# Altium footprint library Integrados.PcbLib: 96 footprints (part 4 of 6)
Each footprint in its own frame and in the unit in brackets; x right, y up, seen from the top. Pads: shape width x height; smd on the part's side, far side on the other; paste and mask are expansions set on the pad; w line width, h text height; cw(c..) or ccw(c..) is an arc to the next point about the centre after c.
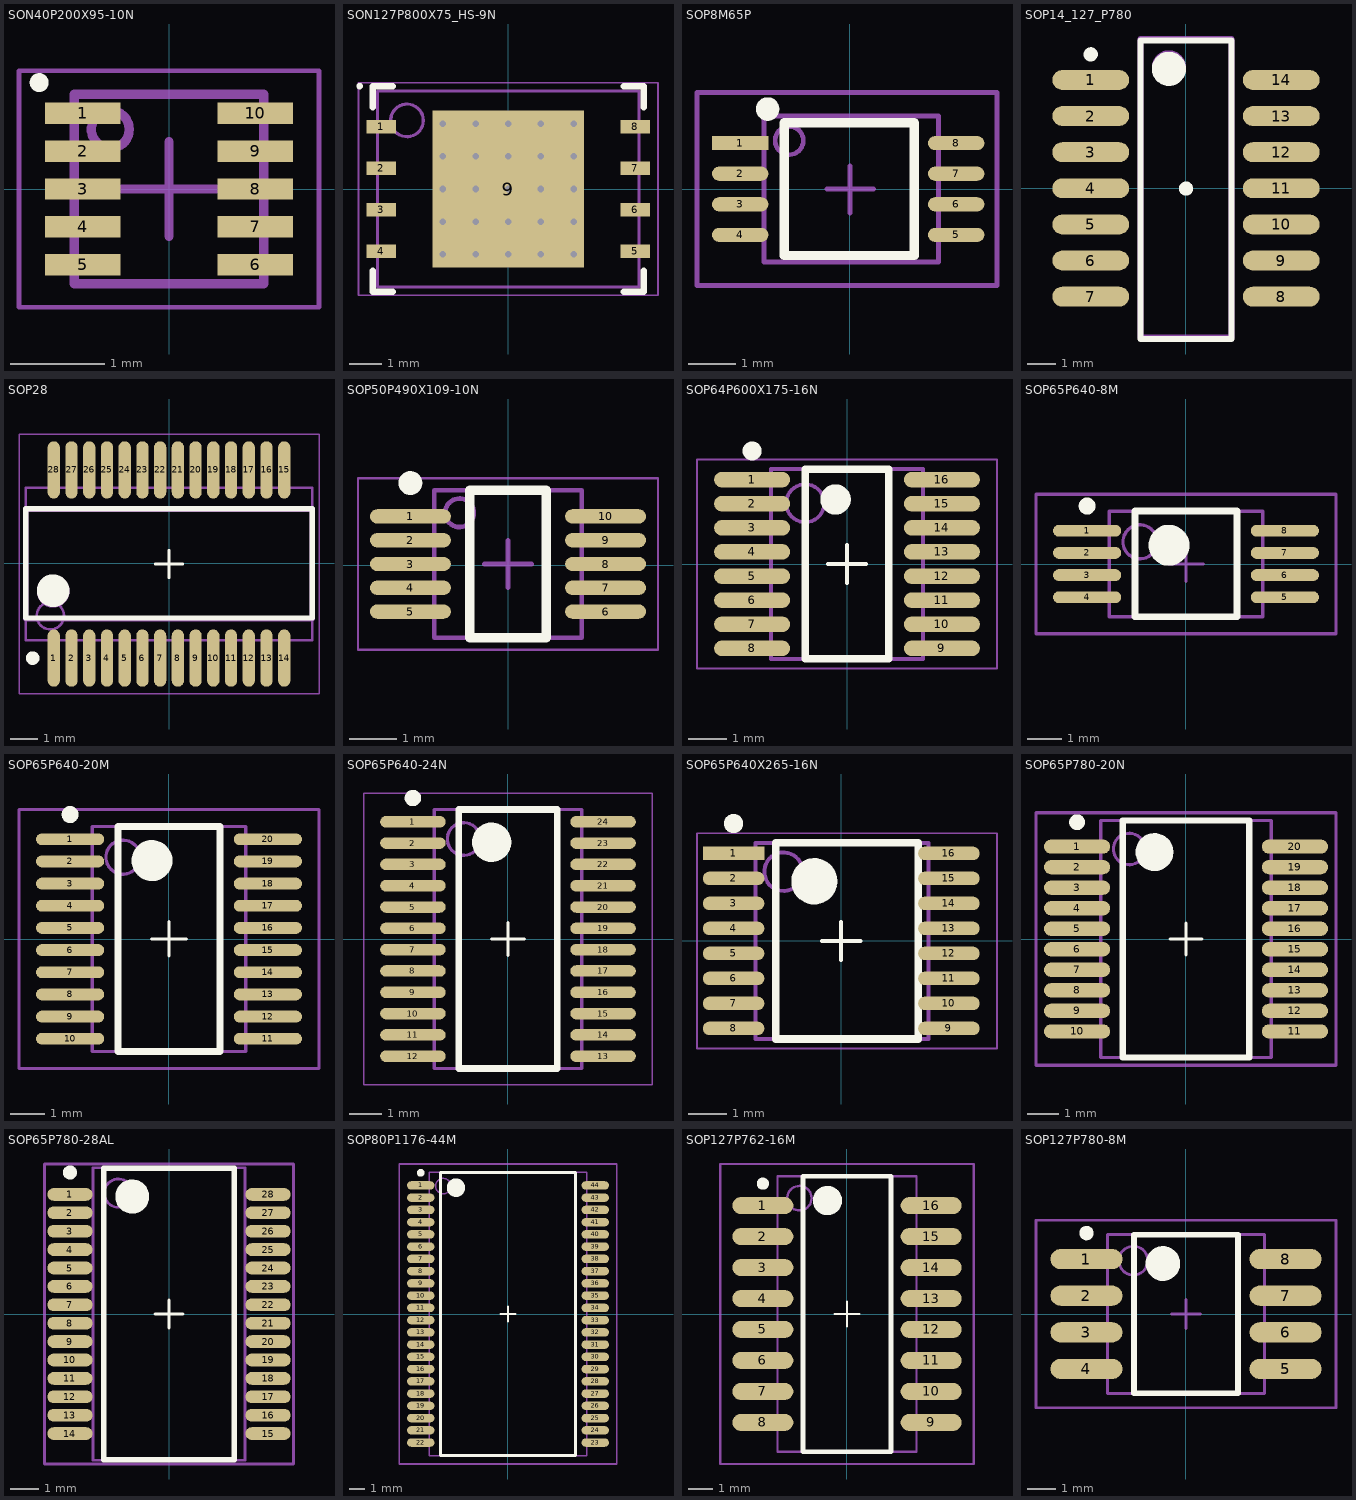
[diagram p3: the footprints below, top view; thin cyan lines are the x and y axes]

## SON40P200X95-10N [mm] "SON, 10-Leads, Body 2,00x2,00mm, Pitch 0,40mm, IPC Medium Density"
height 0.95
pads (10):
  rect 0.8x0.225 smd: 1(-0.911,0.8) 2(-0.911,0.4) 3(-0.911,0) 4(-0.911,-0.4) 5(-0.911,-0.8) 6(0.911,-0.8) 7(0.911,-0.4) 8(0.911,0) 9(0.911,0.4) 10(0.911,0.8)
Top Overlay:
  circle w0.1: c-1.372,1.125 r0.05
Mechanical 15:
  lines w0.05: -1.585,-1.25 1.585,-1.25 1.585,1.25 -1.585,1.25 -1.585,-1.25
  lines w0.1: -0.5,0 0.5,0 ; 0,-0.5 0,0.5
Mechanical 29:
  circle w0.1: c-0.62,0.63 r0.2
  lines w0.1: -1,-1 1,-1 1,1 -1,1 -1,-1
  text "'.Designator'" at 0.269,-0.872 h0.5
3D body "SON40P200X95-10N.step": height 0.95, standoff 0, extent -1.05,-1 1.05,1

## SON127P800X75_HS-9N [mm] "SON, 8-Leads, Body 6,00x8,00mm, Pitch 1,27mm, Thermal Pad 4,80x4,65mm, IPC Medium Density"
height 0.75
pads (9):
  rect 0.9x0.4 smd: 1(-3.89,1.905) 2(-3.89,0.635) 3(-3.89,-0.635) 4(-3.89,-1.905) 5(3.89,-1.905) 6(3.89,-0.635) 7(3.89,0.635) 8(3.89,1.905)
  rect 4.65x4.8 smd paste-2.325 mask+0: 9(0,0)
via 2,-2 diameter 0.5 hole 0.2
via 1,-2 diameter 0.5 hole 0.2
via 0,-2 diameter 0.5 hole 0.2
via -1,-2 diameter 0.5 hole 0.2
via -2,-2 diameter 0.5 hole 0.2
via 2,-1 diameter 0.5 hole 0.2
via 1,-1 diameter 0.5 hole 0.2
via 0,-1 diameter 0.5 hole 0.2
via -1,-1 diameter 0.5 hole 0.2
via -2,-1 diameter 0.5 hole 0.2
via 2,0 diameter 0.5 hole 0.2
via 1,0 diameter 0.5 hole 0.2
via 0,0 diameter 0.5 hole 0.2
via -1,0 diameter 0.5 hole 0.2
via -2,0 diameter 0.5 hole 0.2
via 2,1 diameter 0.5 hole 0.2
via 1,1 diameter 0.5 hole 0.2
via 0,1 diameter 0.5 hole 0.2
via -1,1 diameter 0.5 hole 0.2
via -2,1 diameter 0.5 hole 0.2
via 2,2 diameter 0.5 hole 0.2
via 1,2 diameter 0.5 hole 0.2
via 0,2 diameter 0.5 hole 0.2
via -1,2 diameter 0.5 hole 0.2
via -2,2 diameter 0.5 hole 0.2
Top Overlay:
  circle w0.1: c-4.55,3.15 r0.05
  lines w0.1: -0.5,0 0.5,0 ; 0,-0.5 0,0.5
  lines w0.2: -4.15,-2.505 -4.15,-3.15 -3.54,-3.15 ; -4.15,2.505 -4.15,3.15 -3.54,3.15 ; 3.54,-3.15 4.15,-3.15 4.15,-2.505 ; 3.54,3.15 4.15,3.15 4.15,2.505
Top Paste:
  rectangle: 1.26,-2.3 2.22,-1.3
  rectangle: 1.26,-1.1 2.22,-0.1
  rectangle: 1.26,0.1 2.22,1.1
  rectangle: 1.26,1.3 2.22,2.3
  rectangle: 0.1,-2.3 1.06,-1.3
  rectangle: 0.1,-1.1 1.06,-0.1
  rectangle: 0.1,0.1 1.06,1.1
  rectangle: 0.1,1.3 1.06,2.3
  rectangle: -1.06,-2.3 -0.1,-1.3
  rectangle: -1.06,-1.1 -0.1,-0.1
  rectangle: -1.06,0.1 -0.1,1.1
  rectangle: -1.06,1.3 -0.1,2.3
  rectangle: -2.22,-2.3 -1.26,-1.3
  rectangle: -2.22,-1.1 -1.26,-0.1
  rectangle: -2.22,0.1 -1.26,1.1
  rectangle: -2.22,1.3 -1.26,2.3
Mechanical 15:
  lines w0.05: -4.585,-3.25 4.585,-3.25 4.585,3.25 -4.585,3.25 -4.585,-3.25
Mechanical 29:
  circle w0.1: c-3.1,2.1 r0.5
  lines w0.1: -4,-3 4,-3 4,3 -4,3 -4,-3
  text "'.Designator'" at 0.159,-2.792 h0.5
3D body "WSON-8_6x8mm.STEP": height 0.81, standoff -0.07, extent -4.088,-3.003 3.912,2.997

## SOP8M65P [mm] "SOP 8 pines 65 ptich, 3.1 mm body"
pads (8):
  rect 1.2x0.3 smd: 1(-2.334,0.975)
  oval 1.2x0.3 smd: 2(-2.334,0.325) 3(-2.334,-0.325) 4(-2.334,-0.975) 5(2.258,-0.975) 6(2.258,-0.325) 7(2.258,0.325) 8(2.258,0.975)
Top Overlay:
  circle w0.25: c-1.75,1.7 r0.125
  lines w0.2: -1.397,-1.413 1.372,-1.413 1.372,1.407 -1.397,1.407 -1.397,-1.413
Mechanical 15:
  lines w0.1: -0.493,0 0.507,0 ; 0,-0.508 0,0.492 ; -3.25,-2.05 3.127,-2.05 3.127,2.05 -3.25,2.05 -3.25,-2.05
Mechanical 29:
  circle w0.1: c-1.29,1.03 r0.3
  lines w0.1: -1.826,-1.55 1.882,-1.55 1.882,1.55 -1.826,1.55 -1.826,-1.55
  text "'.Designator'" at 0.189,-1.242 h0.5
3D body "SOP8M65P.STEP": height 1.11, standoff -0.02, extent -1.818,-1.54 1.882,1.61

## SOP14_127_P780 [mm] "14 pines, pitch 1.27mm, ancho 7.8mm"
pads (14):
  oval 2.7x0.7 smd: 1(-3.35,3.81) 2(-3.35,2.54) 3(-3.35,1.27) 4(-3.35,0) 5(-3.35,-1.27) 6(-3.35,-2.54) 7(-3.35,-3.81) 8(3.35,-3.81) 9(3.35,-2.54) 10(3.35,-1.27) 11(3.35,0) 12(3.35,1.27) 13(3.35,2.54) 14(3.35,3.81)
Top Overlay:
  circle w0.25: c0,-0.01 r0.125
  circle w0.6: c-0.6,4.2 r0.3
  circle w0.25: c-3.35,4.71 r0.125
  lines w0.2: -1.6,-5.3 -1.6,5.2 1.6,5.2 1.6,-5.3 -1.6,-5.3
Mechanical 29:
  circle w0.6: c-0.6,4.25 r0.3
  lines w0.2: -1.6,-5.25 1.6,-5.25 1.6,5.25 -1.6,5.25 -1.6,-5.25
  text "'.Designator'" at 0.279,-4.812 h0.5
3D body "SOP14-p127-780.STEP": height 1.1, standoff 0, extent -3.68,-5.125 3.62,5.075

## SOP28 [mm] "SOP, 28-Leads, Body 10.2x5.3mm, Pitch 0.65mm, IPC Medium Density"
pads (28):
  oval 0.45x2.1 smd: 1(-4.229,-3.48) 2(-3.579,-3.48) 3(-2.929,-3.48) 4(-2.279,-3.48) 5(-1.629,-3.48) 6(-0.979,-3.48) 7(-0.329,-3.48) 8(0.321,-3.48) 9(0.971,-3.48) 10(1.621,-3.48) 11(2.271,-3.48) 12(2.921,-3.48) 13(3.571,-3.48) 14(4.221,-3.48) 15(4.221,3.42) 16(3.571,3.42) 17(2.921,3.42) 18(2.271,3.42) 19(1.621,3.42) 20(0.971,3.42) 21(0.321,3.42) 22(-0.329,3.42) 23(-0.979,3.42) 24(-1.629,3.42) 25(-2.279,3.42) 26(-2.929,3.42) 27(-3.579,3.42) 28(-4.229,3.42)
Top Overlay:
  circle w0.25: c-5.004,-3.48 r0.125
  circle w0.6: c-4.254,-1.01 r0.3
  lines w0.1: -0.504,-0.03 0.496,-0.03 ; -0.004,-0.53 -0.004,0.47
  lines w0.2: -5.254,-2.01 5.246,-2.01 5.246,1.99 -5.254,1.99 -5.254,-2.01
Mechanical 13:
  circle w0.1: c-4.354,-1.93 r0.5
  lines w0.1: -5.254,-2.83 -5.254,2.77 5.246,2.77 5.246,-2.83 -5.254,-2.83
Mechanical 15:
  lines w0.05: -5.504,-4.78 -5.504,4.72 5.496,4.72 5.496,-4.78 -5.504,-4.78
Mechanical 29:
  circle w0.6: c-4.254,-1.03 r0.3
  lines w0.2: -5.254,-2.03 -5.254,1.97 5.246,1.97 5.246,-2.03 -5.254,-2.03
  text "'.Designator'" at -0.372,-0.059 h0.5

## SOP50P490X109-10N [mm] "SOP, 10-Leads, Pitch 0.5mm, IPC Low Density"
height 2.03
pads (10):
  oval 1.7x0.3 smd: 1(-2.05,1.025) 2(-2.05,0.525) 3(-2.05,0.025) 4(-2.05,-0.475) 5(-2.05,-0.975) 6(2.05,-0.975) 7(2.05,-0.475) 8(2.05,0.025) 9(2.05,0.525) 10(2.05,1.025)
Top Overlay:
  circle w0.25: c-2.05,1.725 r0.125
  lines w0.2: -0.8,-1.525 0.8,-1.525 0.8,1.575 -0.8,1.575 -0.8,-1.525
Mechanical 15:
  lines w0.05: -3.15,-1.775 3.15,-1.775 3.15,1.825 -3.15,1.825 -3.15,-1.775
  lines w0.1: -0.5,0.025 0.5,0.025 ; 0,-0.475 0,0.525
Mechanical 29:
  circle w0.1: c-1.02,1.1 r0.3
  lines w0.1: -1.55,-1.525 1.55,-1.525 1.55,1.575 -1.55,1.575 -1.55,-1.525
  text "'.Designator'" at 0.259,-1.342 h0.5
3D body "1.step": height 1.24, standoff 0, extent -2.402,-1.525 2.554,1.575

## SOP64P600X175-16N [mm] "SOP, 16-Leads, Body 4,89x3,90mm, Pitch 0,64mm, IPC Medium Density"
height 1.75
pads (16):
  oval 2x0.41 smd: 1(-2.5,2.222) 2(-2.5,1.587) 3(-2.5,0.953) 4(-2.5,0.318) 5(-2.5,-0.318) 6(-2.5,-0.953) 7(-2.5,-1.587) 8(-2.5,-2.222) 9(2.5,-2.222) 10(2.5,-1.587) 11(2.5,-0.953) 12(2.5,-0.318) 13(2.5,0.318) 14(2.5,0.953) 15(2.5,1.587) 16(2.5,2.222)
Top Overlay:
  circle w0.25: c-2.5,2.977 r0.125
  circle w0.4: c-0.3,1.7 r0.2
  lines w0.1: -0.5,0 0.5,0 ; 0,-0.5 0,0.5
  lines w0.2: -1.1,-2.5 -1.1,2.5 1.1,2.5 1.1,-2.5 -1.1,-2.5
Mechanical 15:
  lines w0.05: -3.95,-2.75 -3.95,2.75 3.95,2.75 3.95,-2.75 -3.95,-2.75
Mechanical 29:
  circle w0.1: c-1.1,1.6 r0.5
  lines w0.1: -2,-2.5 -2,2.5 2,2.5 2,-2.5 -2,-2.5
  text "'.Designator'" at 0.139,-2.272 h0.5
3D body "SSOP16.step": height 1.1, standoff 0, extent -2.997,-2.438 2.997,2.54

## SOP65P640-8M [mm] "SOP, 8-Leads, Body 3x4.4mm, Pitch 0.65mm, IPC Low Density"
height 2
pads (8):
  oval 2x0.35 smd: 1(-2.9,0.975) 2(-2.9,0.325) 3(-2.9,-0.325) 4(-2.9,-0.975) 5(2.9,-0.975) 6(2.9,-0.325) 7(2.9,0.325) 8(2.9,0.975)
Top Overlay:
  circle w0.25: c-2.9,1.7 r0.125
  circle w0.6: c-0.5,0.55 r0.3
  lines w0.2: -1.5,-1.55 -1.5,1.55 1.5,1.55 1.5,-1.55 -1.5,-1.55
Mechanical 15:
  lines w0.1: -0.5,0 0.5,0 ; 0,-0.5 0,0.5 ; -4.4,-2.05 -4.4,2.05 4.4,2.05 4.4,-2.05 -4.4,-2.05
Mechanical 29:
  circle w0.1: c-1.35,0.65 r0.5
  lines w0.1: -2.25,-1.55 -2.25,1.55 2.25,1.55 2.25,-1.55 -2.25,-1.55
  text "'.Designator'" at 0.189,-1.332 h0.5

## SOP65P640-20M [mm] "SOP, 20-Leads, Body 6.5x4.4mm, Pitch 0.65mm, IPC Low Density"
height 2
pads (20):
  oval 2x0.35 smd: 1(-2.9,2.925) 2(-2.9,2.275) 3(-2.9,1.625) 4(-2.9,0.975) 5(-2.9,0.325) 6(-2.9,-0.325) 7(-2.9,-0.975) 8(-2.9,-1.625) 9(-2.9,-2.275) 10(-2.9,-2.925) 11(2.9,-2.925) 12(2.9,-2.275) 13(2.9,-1.625) 14(2.9,-0.975) 15(2.9,-0.325) 16(2.9,0.325) 17(2.9,0.975) 18(2.9,1.625) 19(2.9,2.275) 20(2.9,2.925)
Top Overlay:
  circle w0.6: c-0.5,2.3 r0.3
  circle w0.25: c-2.9,3.65 r0.125
  lines w0.1: -0.5,0 0.5,0 ; 0,-0.5 0,0.5
  lines w0.2: -1.5,-3.3 1.5,-3.3 1.5,3.3 -1.5,3.3 -1.5,-3.3
Mechanical 15:
  lines w0.1: -4.4,-3.8 4.4,-3.8 4.4,3.8 -4.4,3.8 -4.4,-3.8
Mechanical 29:
  circle w0.1: c-1.35,2.4 r0.5
  lines w0.1: -2.25,-3.3 2.25,-3.3 2.25,3.3 -2.25,3.3 -2.25,-3.3
  text "'.Designator'" at 0.199,-3.082 h0.5
3D body "SOP65P640-20M.step": height 1.55, standoff 0, extent -3.152,-3.35 3.304,3.35

## SOP65P640-24N [mm] "SOP, 24-Leads, Body 7.8x4.4mm, Pitch 0.65mm, IPC Medium Density"
height 2
pads (24):
  oval 2x0.35 smd: 1(-2.9,3.575) 2(-2.9,2.925) 3(-2.9,2.275) 4(-2.9,1.625) 5(-2.9,0.975) 6(-2.9,0.325) 7(-2.9,-0.325) 8(-2.9,-0.975) 9(-2.9,-1.625) 10(-2.9,-2.275) 11(-2.9,-2.925) 12(-2.9,-3.575) 13(2.9,-3.575) 14(2.9,-2.925) 15(2.9,-2.275) 16(2.9,-1.625) 17(2.9,-0.975) 18(2.9,-0.325) 19(2.9,0.325) 20(2.9,0.975) 21(2.9,1.625) 22(2.9,2.275) 23(2.9,2.925) 24(2.9,3.575)
Top Overlay:
  circle w0.6: c-0.5,2.95 r0.3
  circle w0.25: c-2.9,4.3 r0.125
  lines w0.1: -0.5,0 0.5,0 ; 0,-0.5 0,0.5
  lines w0.2: -1.5,-3.95 1.5,-3.95 1.5,3.95 -1.5,3.95 -1.5,-3.95
Mechanical 15:
  lines w0.05: -4.4,-4.45 4.4,-4.45 4.4,4.45 -4.4,4.45 -4.4,-4.45
Mechanical 29:
  circle w0.1: c-1.35,3.05 r0.5
  lines w0.1: -2.25,-3.95 2.25,-3.95 2.25,3.95 -2.25,3.95 -2.25,-3.95
  text "'.Designator'" at 0.169,-3.642 h0.5
3D body "TSSOP 24 640.step": height 1.15, standoff -0.03, extent -3.127,-3.939 3.28,3.951

## SOP65P640X265-16N [mm] "SOP, 16-Leads, Body 5,00x4,40mm, Pitch 0,65mm, IPC Medium Density"
height 2.65
pads (16):
  rect 1.6x0.35 smd: 1(-2.8,2.275)
  oval 1.6x0.35 smd: 2(-2.8,1.625) 3(-2.8,0.975) 4(-2.8,0.325) 5(-2.8,-0.325) 6(-2.8,-0.975) 7(-2.8,-1.625) 8(-2.8,-2.275) 9(2.8,-2.275) 10(2.8,-1.625) 11(2.8,-0.975) 12(2.8,-0.325) 13(2.8,0.325) 14(2.8,0.975) 15(2.8,1.625) 16(2.8,2.275)
Top Overlay:
  circle w0.25: c-2.8,3.05 r0.125
  circle w0.6: c-0.7,1.55 r0.3
  lines w0.1: -0.502,0 0.498,0 ; -0.002,-0.5 -0.002,0.5
  lines w0.2: -1.7,-2.55 -1.7,2.55 2,2.55 2,-2.55 -1.7,-2.55
Mechanical 15:
  lines w0.05: -3.75,-2.8 -3.75,2.8 4.05,2.8 4.05,-2.8 -3.75,-2.8
Mechanical 29:
  circle w0.1: c-1.5,1.8 r0.5
  lines w0.1: -2.227,-2.55 -2.227,2.55 2.273,2.55 2.273,-2.55 -2.227,-2.55
  text "'.Designator'" at 0.189,-2.292 h0.5
3D body "SOP65P640X265-16N.step": height 2.65, standoff 0, extent -3.253,-2.55 3.147,2.55

## SOP65P780-20N [mm] "SOP, 20-Leads, Body 7.2x5.3mm, Pitch 0.65mm, IPC Medium Density"
height 1.98
pads (20):
  oval 2.1x0.45 smd: 1(-3.45,2.925) 2(-3.45,2.275) 3(-3.45,1.625) 4(-3.45,0.975) 5(-3.45,0.325) 6(-3.45,-0.325) 7(-3.45,-0.975) 8(-3.45,-1.625) 9(-3.45,-2.275) 10(-3.45,-2.925) 11(3.45,-2.925) 12(3.45,-2.275) 13(3.45,-1.625) 14(3.45,-0.975) 15(3.45,-0.325) 16(3.45,0.325) 17(3.45,0.975) 18(3.45,1.625) 19(3.45,2.275) 20(3.45,2.925)
Top Overlay:
  circle w0.6: c-1,2.75 r0.3
  circle w0.25: c-3.45,3.7 r0.125
  lines w0.1: -0.5,0 0.5,0 ; 0,-0.5 0,0.5
  lines w0.2: -2,-3.75 2,-3.75 2,3.75 -2,3.75 -2,-3.75
Mechanical 15:
  lines w0.1: -4.75,-4 4.75,-4 4.75,4 -4.75,4 -4.75,-4
Mechanical 29:
  circle w0.1: c-1.8,2.85 r0.5
  lines w0.1: -2.7,-3.75 2.7,-3.75 2.7,3.75 -2.7,3.75 -2.7,-3.75
  text "'.Designator'" at 0.169,-3.452 h0.5
3D body "SSOP 20 PIN.STEP": height 1.98, standoff -0.01, extent -3.95,-3.665 3.95,3.665

## SOP65P780-28AL [mm] "SOP, 28-Leads, Body 10.2x5.3mm, Pitch 0.65mm, IPC High Density"
height 1.98
pads (28):
  oval 1.6x0.45 smd: 1(-3.5,4.225) 2(-3.5,3.575) 3(-3.5,2.925) 4(-3.5,2.275) 5(-3.5,1.625) 6(-3.5,0.975) 7(-3.5,0.325) 8(-3.5,-0.325) 9(-3.5,-0.975) 10(-3.5,-1.625) 11(-3.5,-2.275) 12(-3.5,-2.925) 13(-3.5,-3.575) 14(-3.5,-4.225) 15(3.5,-4.225) 16(3.5,-3.575) 17(3.5,-2.925) 18(3.5,-2.275) 19(3.5,-1.625) 20(3.5,-0.975) 21(3.5,-0.325) 22(3.5,0.325) 23(3.5,0.975) 24(3.5,1.625) 25(3.5,2.275) 26(3.5,2.925) 27(3.5,3.575) 28(3.5,4.225)
Top Overlay:
  circle w0.6: c-1.3,4.15 r0.3
  circle w0.25: c-3.5,5 r0.125
  lines w0.1: -0.5,0 0.5,0 ; 0,-0.5 0,0.5
  lines w0.2: -2.3,-5.15 2.3,-5.15 2.3,5.15 -2.3,5.15 -2.3,-5.15
Mechanical 15:
  lines w0.1: -4.4,-5.3 4.4,-5.3 4.4,5.3 -4.4,5.3 -4.4,-5.3
Mechanical 29:
  circle w0.1: c-1.79,4.27 r0.5
  lines w0.1: -2.69,-5.17 2.69,-5.17 2.69,5.17 -2.69,5.17 -2.69,-5.17
  text "'.Designator'" at 0.039,-0.372 h0.5
3D body "SSOP-28.step": height 1.92, standoff -0.03, extent -4.138,-5.217 4.087,5.283

## SOP80P1176-44M [mm] "SOP, 44-Leads, Body 18.4x10.16mm, Pitch 0.8mm, IPC Low Density"
height 1.2
pads (44):
  oval 1.8x0.55 smd: 1(-5.7,8.4) 2(-5.7,7.6) 3(-5.7,6.8) 4(-5.7,6) 5(-5.7,5.2) 6(-5.7,4.4) 7(-5.7,3.6) 8(-5.7,2.8) 9(-5.7,2) 10(-5.7,1.2) 11(-5.7,0.4) 12(-5.7,-0.4) 13(-5.7,-1.2) 14(-5.7,-2) 15(-5.7,-2.8) 16(-5.7,-3.6) 17(-5.7,-4.4) 18(-5.7,-5.2) 19(-5.7,-6) 20(-5.7,-6.8) 21(-5.7,-7.6) 22(-5.7,-8.4) 23(5.7,-8.4) 24(5.7,-7.6) 25(5.7,-6.8) 26(5.7,-6) 27(5.7,-5.2) 28(5.7,-4.4) 29(5.7,-3.6) 30(5.7,-2.8) 31(5.7,-2) 32(5.7,-1.2) 33(5.7,-0.4) 34(5.7,0.4) 35(5.7,1.2) 36(5.7,2) 37(5.7,2.8) 38(5.7,3.6) 39(5.7,4.4) 40(5.7,5.2) 41(5.7,6) 42(5.7,6.8) 43(5.7,7.6) 44(5.7,8.4)
Top Overlay:
  circle w0.6: c-3.4,8.25 r0.3
  circle w0.25: c-5.7,9.225 r0.125
  lines w0.1: -0.5,0 0.5,0 ; 0,-0.5 0,0.5
  lines w0.2: -4.4,-9.25 4.4,-9.25 4.4,9.25 -4.4,9.25 -4.4,-9.25
Mechanical 15:
  lines w0.1: -7.1,-9.8 7.1,-9.8 7.1,9.8 -7.1,9.8 -7.1,-9.8
Mechanical 29:
  circle w0.1: c-4.23,8.36 r0.5
  lines w0.1: -5.13,-9.26 5.13,-9.26 5.13,9.26 -5.13,9.26 -5.13,-9.26
  text "'.Designator'" at 0.069,-0.352 h0.5
3D body "TSOP2-44_IS.STEP": height 1.3, standoff -0.09, extent -5.905,-9.142 5.855,9.068

## SOP127P762-16M [mm] "16-Pin Small Outline Package 1.27 mm Pitch"
height 2.2
pads (16):
  oval 2.5x0.7 smd: 1(-3.45,4.445) 2(-3.45,3.175) 3(-3.45,1.905) 4(-3.45,0.635) 5(-3.45,-0.635) 6(-3.45,-1.905) 7(-3.45,-3.175) 8(-3.45,-4.445) 9(3.45,-4.445) 10(3.45,-3.175) 11(3.45,-1.905) 12(3.45,-0.635) 13(3.45,0.635) 14(3.45,1.905) 15(3.45,3.175) 16(3.45,4.445)
Top Overlay:
  circle w0.6: c-0.8,4.65 r0.3
  circle w0.25: c-3.45,5.345 r0.125
  lines w0.1: -0.5,0 0.5,0 ; 0,-0.5 0,0.5
  lines w0.2: -1.8,-5.65 1.8,-5.65 1.8,5.65 -1.8,5.65 -1.8,-5.65
Mechanical 15:
  lines w0.1: -5.2,-6.15 5.2,-6.15 5.2,6.15 -5.2,6.15 -5.2,-6.15
Mechanical 29:
  circle w0.1: c-1.95,4.75 r0.5
  lines w0.1: -2.85,-5.65 2.85,-5.65 2.85,5.65 -2.85,5.65 -2.85,-5.65
  text "'.Designator'" at 0.03,-0.38 h0.5
3D body "SOP16_208mil (5_3mm).STEP": height 2, standoff 0, extent -4.011,-5.1 3.91,5.1

## SOP127P780-8M [mm] "SOP, 8-Leads, Body 5.3x5.3mm, Pitch 1.27mm, IPC Low Density"
height 2.03
pads (8):
  oval 2.5x0.7 smd: 1(-3.45,1.905) 2(-3.45,0.635) 3(-3.45,-0.635) 4(-3.45,-1.905) 5(3.45,-1.905) 6(3.45,-0.635) 7(3.45,0.635) 8(3.45,1.905)
Top Overlay:
  circle w0.25: c-3.45,2.805 r0.125
  circle w0.6: c-0.8,1.75 r0.3
  lines w0.2: -1.8,-2.75 -1.8,2.75 1.8,2.75 1.8,-2.75 -1.8,-2.75
Mechanical 15:
  lines w0.1: -0.5,0 0.5,0 ; 0,-0.5 0,0.5 ; -5.2,-3.25 -5.2,3.25 5.2,3.25 5.2,-3.25 -5.2,-3.25
Mechanical 29:
  circle w0.1: c-1.825,1.85 r0.5
  lines w0.1: -2.725,-2.75 -2.725,2.75 2.725,2.75 2.725,-2.75 -2.725,-2.75
  text "'.Designator'" at 0.039,-0.382 h0.5
3D body "SOP127P780-8M.step": height 1.75, standoff -0.01, extent -4.077,-2.73 4.025,2.73